# Altium footprint library TYCO THD.PcbLib: 146 footprints (part 10 of 11)
Each footprint in its own frame and in the unit in brackets; x right, y up, seen from the top. Pads: shape width x height; smd on the part's side, far side on the other; paste and mask are expansions set on the pad; w line width, h text height; cw(c..) or ccw(c..) is an arc to the next point about the centre after c.
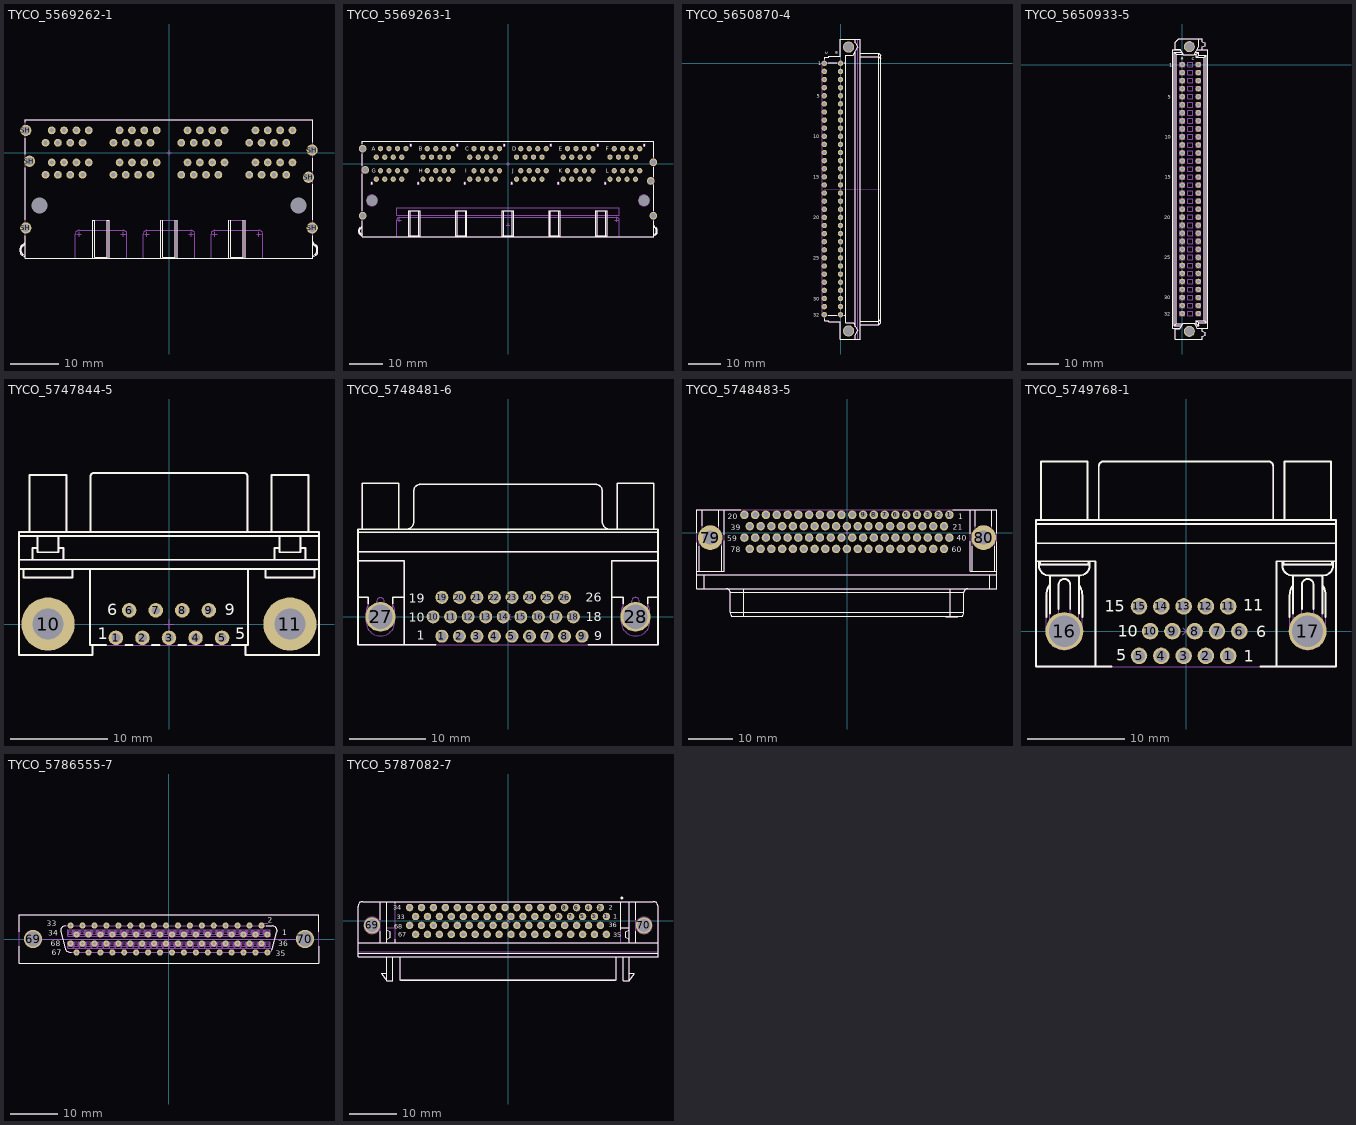
[diagram p9: the footprints below, top view; thin cyan lines are the x and y axes]

## TYCO_5569262-1 [mm] "2 x 4 Port RJ45 Jacks"
height 26.29
pads (72):
  round 1.6 hole 0.9: 1LCL(-11.43,-4.568) 1LCR(2.54,-4.568) 1LL(-25.4,-4.568) 1LR(16.51,-4.568) 1UCL(-2.54,4.572) 1UCR(11.43,4.572) 1UL(-16.51,4.572) 1UR(25.4,4.572) 2LCL(-10.16,-2.028) 2LCR(3.81,-2.028) 2LL(-24.13,-2.028) 2LR(17.78,-2.028) 2UCL(-3.81,2.032) 2UCR(10.16,2.032) 2UL(-17.78,2.032) 2UR(24.13,2.032) 3LCL(-8.89,-4.568) 3LCR(5.08,-4.568) 3LL(-22.86,-4.568) 3LR(19.05,-4.568) 3UCL(-5.08,4.572) 3UCR(8.89,4.572) 3UL(-19.05,4.572) 3UR(22.86,4.572) 4LCL(-7.62,-2.028) 4LCR(6.35,-2.028) 4LL(-21.59,-2.028) 4LR(20.32,-2.028) 4UCL(-6.35,2.032) 4UCR(7.62,2.032) 4UL(-20.32,2.032) 4UR(21.59,2.032) 5LCL(-6.35,-4.568) 5LCR(7.62,-4.568) 5LL(-20.32,-4.568) 5LR(21.59,-4.568) 5UCL(-7.62,4.572) 5UCR(6.35,4.572) 5UL(-21.59,4.572) 5UR(20.32,4.572) 6LCL(-5.08,-2.028) 6LCR(8.89,-2.028) 6LL(-19.05,-2.028) 6LR(22.86,-2.028) 6UCL(-8.89,2.032) 6UCR(5.08,2.032) 6UL(-22.86,2.032) 6UR(19.05,2.032) 7LCL(-3.81,-4.568) 7LCR(10.16,-4.568) 7LL(-17.78,-4.568) 7LR(24.13,-4.568) 7UCL(-10.16,4.572) 7UCR(3.81,4.572) 7UL(-24.13,4.572) 7UR(17.78,4.572) 8LCL(-2.54,-2.028) 8LCR(11.43,-2.028) 8LL(-16.51,-2.028) 8LR(25.4,-2.028) 8UCL(-11.43,2.032) 8UCR(2.54,2.032) 8UL(-25.4,2.032) 8UR(16.51,2.032)
  round 0.5 hole 3.3 unplated mask+1.4: M1(26.67,-10.918) M2(-26.67,-10.918)
  round 2.3 hole 1.6: SH(-29.46,-15.488) SH(-29.46,4.572) SH(-28.702,-1.778) SH(28.7,-5.078) SH(29.458,0.512) SH(29.46,-15.488)
Top Overlay:
  lines w0.2: -29.591,-21.39 -30.17,-21.12 cw(c-29.85,-20.434) -30.607,-20.434 -30.607,-19.68 cw(c-29.85,-19.68) -30.284,-19.06 -29.808,-18.726 ccw(c-30.099,-18.31) -29.591,-18.31 ; -29.591,-21.116 -30.065,-20.895 cw(c-29.85,-20.434) -30.358,-20.434 -30.358,-19.68 cw(c-29.85,-19.68) -30.141,-19.264 -29.665,-18.93 ccw(c-30.099,-18.31) -29.591,-18.871 ; -29.591,-17.133 -29.591,-21.712 29.591,-21.712 29.591,-17.133 ; -29.591,-13.843 -29.591,-3.168 ; -29.591,-0.388 -29.591,2.927 ; -29.591,6.217 -29.591,6.736 29.591,6.736 29.591,2.157 ; -15.684,-21.712 -15.684,-13.965 -15.24,-13.965 -15.24,-21.509 -12.7,-21.509 -12.7,-13.965 -12.255,-13.965 -12.255,-21.712 ; -1.714,-21.712 -1.714,-13.965 ; -1.27,-13.965 -1.27,-21.509 1.27,-21.509 1.27,-13.965 ; 1.714,-21.712 1.714,-13.965 ; 12.255,-21.712 12.255,-13.965 ; 12.7,-13.965 12.7,-21.509 15.24,-21.509 15.24,-13.965 ; 15.684,-21.712 15.684,-13.965 ; 29.591,-21.39 30.17,-21.12 ccw(c29.85,-20.434) 30.607,-20.434 30.607,-19.68 ccw(c29.85,-19.68) 30.284,-19.06 29.808,-18.726 cw(c30.099,-18.31) 29.591,-18.31 ; 29.591,-21.116 30.065,-20.895 ccw(c29.85,-20.434) 30.358,-20.434 30.358,-19.68 ccw(c29.85,-19.68) 30.141,-19.264 29.665,-18.93 cw(c30.099,-18.31) 29.591,-18.871 ; 29.591,-13.843 29.591,-6.467 ; 29.591,-3.689 29.591,-1.133
Mechanical 8:
  drawing of 331 lines, arcs and shapes, not listed
Mechanical 14:
  lines w0.1: -29.591,-21.39 -30.17,-21.12 cw(c-29.85,-20.434) -30.607,-20.434 -30.607,-19.68 cw(c-29.85,-19.68) -30.284,-19.06 -29.808,-18.726 ccw(c-30.099,-18.31) -29.591,-18.31 ; -29.591,-21.116 -30.065,-20.895 cw(c-29.85,-20.434) -30.358,-20.434 -30.358,-19.68 cw(c-29.85,-19.68) -30.141,-19.264 -29.665,-18.93 ccw(c-30.099,-18.31) -29.591,-18.871 ; -15.684,-21.712 -15.684,-13.965 -12.255,-13.965 -12.255,-21.712 ; -15.24,-13.965 -15.24,-21.509 -12.7,-21.509 -12.7,-13.965 ; -1.714,-21.712 -1.714,-13.965 1.714,-13.965 1.714,-21.712 ; -1.27,-13.965 -1.27,-21.509 1.27,-21.509 1.27,-13.965 ; 12.255,-21.712 12.255,-13.965 15.684,-13.965 15.684,-21.712 ; 12.7,-13.965 12.7,-21.509 15.24,-21.509 15.24,-13.965 ; 29.591,-21.39 30.17,-21.12 ccw(c29.85,-20.434) 30.607,-20.434 30.607,-19.68 ccw(c29.85,-19.68) 30.284,-19.06 29.808,-18.726 cw(c30.099,-18.31) 29.591,-18.31 ; 29.591,-21.116 30.065,-20.895 ccw(c29.85,-20.434) 30.358,-20.434 30.358,-19.68 ccw(c29.85,-19.68) 30.141,-19.264 29.665,-18.93 cw(c30.099,-18.31) 29.591,-18.871 ; -29.591,-21.712 29.591,-21.712 29.591,6.736 -29.591,6.736 -29.591,-21.712
3D body "TYCO_5569262-1.stp": height 26.29, standoff -4.06, extent -30.607,-21.712 30.607,6.736

## TYCO_5569263-1 [mm] "2 x 6 Port RJ45 Jacks"
height 26.27
pads (104):
  round 1.6 hole 0.9: 1A(-30.48,4.568) 1B(-16.51,4.568) 1C(-2.54,4.568) 1D(11.43,4.568) 1E(25.4,4.568) 1G(-39.37,-4.572) 1H(-25.4,-4.572) 1I(-11.43,-4.572) 1J(2.54,-4.572) 1K(16.51,-4.572) 1L(30.48,-4.572) 2A(-31.75,2.028) 2B(-17.78,2.028) 2C(-3.81,2.028) 2D(10.16,2.028) 2E(24.13,2.028) 2F(38.1,2.028) 2G(-38.1,-2.032) 2H(-24.13,-2.032) 2I(-10.16,-2.032) 2J(3.81,-2.032) 2K(17.78,-2.032) 2L(31.75,-2.032) 3A(-33.02,4.568) 3B(-19.05,4.568) 3C(-5.08,4.568) 3D(8.89,4.568) 3E(22.86,4.568) 3F(36.83,4.568) 3G(-36.83,-4.572) 3H(-22.86,-4.572) 3I(-8.89,-4.572) 3J(5.08,-4.572) 3K(19.05,-4.572) 3L(33.02,-4.572) 4A(-34.29,2.028) 4B(-20.32,2.028) 4C(-6.35,2.028) 4D(7.62,2.028) 4E(21.59,2.028) 4F(35.56,2.028) 4G(-35.56,-2.032) 4H(-21.59,-2.032) 4I(-7.62,-2.032) 4J(6.35,-2.032) 4K(20.32,-2.032) 4L(34.29,-2.032) 5A(-35.56,4.568) 5B(-21.59,4.568) 5C(-7.62,4.568) 5D(6.35,4.568) 5E(20.32,4.568) 5F(34.29,4.568) 5G(-34.29,-4.572) 5H(-20.32,-4.572) 5I(-6.35,-4.572) 5J(7.62,-4.572) 5K(21.59,-4.572) 5L(35.56,-4.572) 6A(-36.83,2.028) 6B(-22.86,2.028) 6C(-8.89,2.028) 6D(5.08,2.028) 6E(19.05,2.028) 6F(33.02,2.028) 6G(-33.02,-2.032) 6H(-19.05,-2.032) 6I(-5.08,-2.032) 6J(8.89,-2.032) 6K(22.86,-2.032) 6L(36.83,-2.032) 7A(-38.1,4.568) 7B(-24.13,4.568) 7C(-10.16,4.568) 7D(3.81,4.568) 7E(17.78,4.568) 7F(31.75,4.568) 7G(-31.75,-4.572) 7H(-17.78,-4.572) 7I(-3.81,-4.572) 7J(10.16,-4.572) 7K(24.13,-4.572) 7L(38.1,-4.572) 8A(-39.37,2.028) 8B(-25.4,2.028) 8C(-11.43,2.028) 8D(2.54,2.028) 8E(16.51,2.028) 8F(30.48,2.028) 8G(-30.48,-2.032) 8H(-16.51,-2.032) 8I(-2.54,-2.032) 8J(11.43,-2.032) 8K(25.4,-2.032) 8L(39.37,-2.032) F1(39.37,4.568)
  round 0.5 hole 3.3 unplated mask+1.4: M1(40.642,-10.922) M2(-40.64,-10.922)
  round 2.3 hole 1.6: SH(-43.43,-15.492) SH(-43.43,4.568) SH(-42.672,-1.782) SH(42.672,-5.082) SH(43.43,0.508) SH(43.432,-15.492)
Top Overlay:
  circle w0.3: c-40.75,-5.8 r0.15
  circle w0.3: c-26.86,-5.8 r0.15
  circle w0.3: c-12.89,-5.8 r0.15
  circle w0.3: c15.05,-5.8 r0.15
  circle w0.3: c1.08,-5.8 r0.15
  circle w0.3: c29.02,-5.8 r0.15
  circle w0.3: c40.75,5.6 r0.15
  circle w0.3: c26.78,5.6 r0.15
  circle w0.3: c12.81,5.6 r0.15
  circle w0.3: c-1.16,5.6 r0.15
  circle w0.3: c-15.13,5.6 r0.15
  circle w0.3: c-29.1,5.6 r0.15
  lines w0.2: -43.561,-21.4 -44.14,-21.13 cw(c-43.82,-20.444) -44.577,-20.444 -44.577,-19.69 cw(c-43.82,-19.69) -44.254,-19.07 -43.778,-18.736 ccw(c-44.069,-18.32) -43.561,-18.32 ; -43.561,-21.126 -44.035,-20.905 cw(c-43.82,-20.444) -44.328,-20.444 -44.328,-19.69 cw(c-43.82,-19.69) -44.205,-19.359 -43.635,-18.94 ccw(c-44.069,-18.32) -43.561,-18.881 ; -43.561,-16.986 -43.561,-21.717 43.561,-21.717 43.561,-16.986 ; -43.561,-13.998 -43.561,-2.989 ; -43.561,-0.575 -43.561,3.074 ; -43.561,6.062 -43.561,6.731 43.561,6.731 43.561,2.002 ; -29.654,-21.717 -29.654,-13.975 -26.226,-13.975 -26.226,-21.717 ; -29.654,-21.468 -29.21,-21.468 ; -29.21,-13.975 -29.21,-21.519 -26.67,-21.519 -26.67,-13.975 ; -26.67,-21.468 -26.226,-21.468 ; -15.686,-21.468 -15.24,-21.468 ; -15.684,-21.717 -15.684,-13.975 -12.255,-13.975 -12.255,-21.717 ; -15.24,-13.975 -15.24,-21.519 -12.7,-21.519 -12.7,-13.975 ; -12.7,-21.468 -12.255,-21.468 ; -1.714,-21.717 -1.714,-13.975 1.714,-13.975 1.714,-21.717 ; -1.705,-21.468 -1.27,-21.468 ; -1.27,-13.975 -1.27,-21.519 1.27,-21.519 1.27,-13.975 ; 1.27,-21.468 1.714,-21.468 ; 12.255,-21.717 12.255,-13.975 15.684,-13.975 15.684,-21.717 ; 12.255,-21.468 12.7,-21.468 ; 12.7,-13.975 12.7,-21.519 15.24,-21.519 15.24,-13.975 ; 15.24,-21.468 15.684,-21.468 ; 26.226,-21.717 26.226,-13.975 29.654,-13.975 29.654,-21.717 ; 26.226,-21.468 26.67,-21.468 ; 26.67,-13.975 26.67,-21.519 29.21,-21.519 29.21,-13.975 ; 29.21,-21.468 29.654,-21.468 ; 43.561,-21.4 44.14,-21.13 ccw(c43.82,-20.444) 44.577,-20.444 44.577,-19.69 ccw(c43.82,-19.69) 44.254,-19.07 43.778,-18.736 cw(c44.069,-18.32) 43.561,-18.32 ; 43.561,-21.126 44.035,-20.905 ccw(c43.82,-20.444) 44.328,-20.444 44.328,-19.69 ccw(c43.82,-19.69) 44.111,-19.274 43.635,-18.94 cw(c44.069,-18.32) 43.561,-18.881 ; 43.561,-13.998 43.561,-6.289 ; 43.561,-3.875 43.561,-0.986
  text "F" at 29.15,4 h1.2
  text "E" at 15.18,4 h1.2
  text "D" at 1.21,4 h1.2
  text "C" at -12.76,4 h1.2
  text "B" at -26.73,4 h1.2
  text "A" at -40.7,4 h1.2
  text "G" at -40.7,-2.6 h1.2
  text "H" at -26.73,-2.6 h1.2
  text "I" at -12.76,-2.6 h1.2
  text "J" at 1.21,-2.6 h1.2
  text "K" at 15.18,-2.6 h1.2
  text "L" at 29.15,-2.6 h1.2
Mechanical 8:
  drawing of 448 lines, arcs and shapes, not listed
Mechanical 14:
  circle w0.1: c-40.75,-5.8 r0.3
  circle w0.1: c-26.86,-5.8 r0.3
  circle w0.1: c-12.89,-5.8 r0.3
  circle w0.1: c15.05,-5.8 r0.3
  circle w0.1: c1.08,-5.8 r0.3
  circle w0.1: c29.02,-5.8 r0.3
  circle w0.1: c40.75,5.6 r0.3
  circle w0.1: c26.78,5.6 r0.3
  circle w0.1: c12.81,5.6 r0.3
  circle w0.1: c-1.16,5.6 r0.3
  circle w0.1: c-15.13,5.6 r0.3
  circle w0.1: c-29.1,5.6 r0.3
  lines w0.1: -43.561,-21.4 -44.14,-21.13 cw(c-43.82,-20.444) -44.577,-20.444 -44.577,-19.69 cw(c-43.82,-19.69) -44.254,-19.07 -43.778,-18.736 ccw(c-44.069,-18.32) -43.561,-18.32 ; -43.561,-21.126 -44.035,-20.905 cw(c-43.82,-20.444) -44.328,-20.444 -44.328,-19.69 cw(c-43.82,-19.69) -44.205,-19.359 -43.635,-18.94 ccw(c-44.069,-18.32) -43.561,-18.881 ; -29.654,-21.717 -29.654,-13.975 -26.226,-13.975 -26.226,-21.717 ; -29.654,-21.468 -29.21,-21.468 ; -29.21,-13.975 -29.21,-21.519 -26.67,-21.519 -26.67,-13.975 ; -26.67,-21.468 -26.226,-21.468 ; -15.686,-21.468 -15.24,-21.468 ; -15.684,-21.717 -15.684,-13.975 -12.255,-13.975 -12.255,-21.717 ; -15.24,-13.975 -15.24,-21.519 -12.7,-21.519 -12.7,-13.975 ; -12.7,-21.468 -12.255,-21.468 ; -1.714,-21.717 -1.714,-13.975 1.714,-13.975 1.714,-21.717 ; -1.705,-21.468 -1.27,-21.468 ; -1.27,-13.975 -1.27,-21.519 1.27,-21.519 1.27,-13.975 ; 1.27,-21.468 1.714,-21.468 ; 12.255,-21.717 12.255,-13.975 15.684,-13.975 15.684,-21.717 ; 12.255,-21.468 12.7,-21.468 ; 12.7,-13.975 12.7,-21.519 15.24,-21.519 15.24,-13.975 ; 15.24,-21.468 15.684,-21.468 ; 26.226,-21.717 26.226,-13.975 29.654,-13.975 29.654,-21.717 ; 26.226,-21.468 26.67,-21.468 ; 26.67,-13.975 26.67,-21.519 29.21,-21.519 29.21,-13.975 ; 29.21,-21.468 29.654,-21.468 ; 43.561,-21.4 44.14,-21.13 ccw(c43.82,-20.444) 44.577,-20.444 44.577,-19.69 ccw(c43.82,-19.69) 44.254,-19.07 43.778,-18.736 cw(c44.069,-18.32) 43.561,-18.32 ; 43.561,-21.126 44.035,-20.905 ccw(c43.82,-20.444) 44.328,-20.444 44.328,-19.69 ccw(c43.82,-19.69) 44.111,-19.274 43.635,-18.94 cw(c44.069,-18.32) 43.561,-18.881 ; -43.561,-21.717 43.561,-21.717 43.561,6.731 -43.561,6.731 -43.561,-21.717
  text "F" at 29.15,4 h1.2
  text "E" at 15.18,4 h1.2
  text "D" at 1.21,4 h1.2
  text "C" at -12.76,4 h1.2
  text "B" at -26.73,4 h1.2
  text "A" at -40.7,4 h1.2
  text "G" at -40.7,-2.6 h1.2
  text "H" at -26.73,-2.6 h1.2
  text "I" at -12.76,-2.6 h1.2
  text "J" at 1.21,-2.6 h1.2
  text "K" at 15.18,-2.6 h1.2
  text "L" at 29.15,-2.6 h1.2
3D body "TYCO_5569263-1.stp": height 26.33, standoff -4.06, extent -44.577,-21.717 44.577,6.731

## TYCO_5650870-4 [mm] "DIN 41612 Class 2, Type R, Thru-Hole; Rows a+c, 64 Positions, Performance level 2, Lead 2.79mm, Right Angle Female Connector"
height 9.11
pads (66):
  round 1.7 hole 1: a1(0,0) a2(0,-2.54) a3(0,-5.08) a4(0,-7.62) a5(0,-10.16) a6(0,-12.7) a7(0,-15.24) a8(0,-17.78) a9(0,-20.32) a10(0,-22.86) a11(0,-25.4) a12(0,-27.94) a13(0,-30.48) a14(0,-33.02) a15(0,-35.56) a16(0,-38.1) a17(0,-40.64) a18(0,-43.18) a19(0,-45.72) a20(0,-48.26) a21(0,-50.8) a22(0,-53.34) a23(0,-55.88) a24(0,-58.42) a25(0,-60.96) a26(0,-63.5) a27(0,-66.04) a28(0,-68.58) a29(0,-71.12) a30(0,-73.66) a31(0,-76.2) a32(0,-78.74) c1(-5.08,0) c2(-5.08,-2.54) c3(-5.08,-5.08) c4(-5.08,-7.62) c5(-5.08,-10.16) c6(-5.08,-12.7) c7(-5.08,-15.24) c8(-5.08,-17.78) c9(-5.08,-20.32) c10(-5.08,-22.86) c11(-5.08,-25.4) c12(-5.08,-27.94) c13(-5.08,-30.48) c14(-5.08,-33.02) c15(-5.08,-35.56) c16(-5.08,-38.1) c17(-5.08,-40.64) c18(-5.08,-43.18) c19(-5.08,-45.72) c20(-5.08,-48.26) c21(-5.08,-50.8) c22(-5.08,-53.34) c23(-5.08,-55.88) c24(-5.08,-58.42) c25(-5.08,-60.96) c26(-5.08,-63.5) c27(-5.08,-66.04) c28(-5.08,-68.58) c29(-5.08,-71.12) c30(-5.08,-73.66) c31(-5.08,-76.2) c32(-5.08,-78.74)
  round 3.5 / inner round 3.5 / far side round 5.1 hole 2.8: MTG1(2.54,5.08) MTG2(2.54,-83.82)
Top Overlay:
  lines w0.2: -5.01,-79.988 -5.01,-80.685 -3.76,-80.685 -3.76,-81 -0.06,-81 -0.06,-86.36 6.14,-86.36 6.14,7.62 -0.06,7.62 -0.06,2.26 -3.76,2.26 -3.76,1.945 -5.01,1.945 -5.01,1.248 ; -3.839,-78.89 -1.241,-78.89 ; -3.839,0.15 -1.241,0.15 ; 1.241,-78.89 1.64,-78.89 ; 1.241,0.15 1.64,0.15 ; 4.64,-86.36 4.64,-85.163 5.415,-83.82 3.978,-81.33 1.64,-81.33 1.64,2.59 3.978,2.59 5.415,5.08 4.64,6.423 4.64,7.62 ; 4.64,-82.477 4.64,3.737 ; 6.14,-81.82 12.03,-81.82 ; 6.14,-80.78 12.03,-80.78 12.64,-80.17 ; 6.14,2.04 12.03,2.04 12.64,1.43 ; 6.14,3.08 12.03,3.08 ; 12.03,-81.82 12.03,3.08 ; 12.03,-81.82 12.64,-81.21 12.64,2.47 12.03,3.08
  text "1" at -7.045,-0.55 h1.2
  text "c" at -4.055,2.865 h1.2
  text "a" at -0.8,2.915 h1.2
  text "32" at -8.57,-79.39 h1.2
  text "5" at -7.445,-10.86 h1.2
  text "10" at -8.495,-23.51 h1.2
  text "15" at -8.47,-36.11 h1.2
  text "20" at -8.57,-48.91 h1.2
  text "25" at -8.57,-61.61 h1.2
  text "30" at -8.57,-74.31 h1.2
Mechanical 8:
  drawing of 267 lines, arcs and shapes, not listed
  text "PCB" at 5.08,-41.275 h1.2
Mechanical 14:
  lines w0.1: -5.01,-78.89 -5.01,-80.685 -3.76,-80.685 -3.76,-81 -0.06,-81 -0.06,-86.36 6.14,-86.36 6.14,7.62 -0.06,7.62 -0.06,2.26 -3.76,2.26 -3.76,1.945 -5.01,1.945 -5.01,0.15 ; 1.64,-78.89 -5.72,-78.89 -5.72,0.15 1.64,0.15 ; 4.64,-86.36 4.64,-85.163 5.415,-83.82 3.978,-81.33 1.64,-81.33 1.64,2.59 3.978,2.59 5.415,5.08 4.64,6.423 4.64,7.62 ; 4.64,-82.477 4.64,3.737 ; 6.14,-81.82 12.03,-81.82 ; 6.14,-80.78 12.03,-80.78 12.64,-80.17 ; 6.14,2.04 12.03,2.04 12.64,1.43 ; 6.14,3.08 12.03,3.08 ; 12.03,-81.82 12.03,3.08 ; 12.03,-81.82 12.64,-81.21 12.64,2.47 12.03,3.08 ; 1.005,-84.16 1.005,-83.48 1.316,-83.48 cw(c2.54,-83.82) 3.764,-83.48 4.075,-83.48 4.075,-84.16 3.764,-84.16 cw(c2.54,-83.82) 1.316,-84.16 1.005,-84.16 ; 1.005,4.74 1.316,4.74 ccw(c2.54,5.08) 3.764,4.74 4.075,4.74 4.075,5.42 3.764,5.42 ccw(c2.54,5.08) 1.316,5.42 1.005,5.42 1.005,4.74
  text "1" at -7.045,-0.55 h1.2
  text "c" at -4.055,2.865 h1.2
  text "a" at -0.8,2.915 h1.2
  text "32" at -8.57,-79.39 h1.2
  text "5" at -7.445,-10.86 h1.2
  text "10" at -8.495,-23.51 h1.2
  text "15" at -8.47,-36.11 h1.2
  text "20" at -8.57,-48.91 h1.2
  text "25" at -8.57,-61.61 h1.2
  text "30" at -8.57,-74.31 h1.2
3D body "TYCO_5650870-4.stp": height 9.11, standoff -2.79, extent -5.72,-86.36 12.64,7.62

## TYCO_5650933-5 [mm] "DIN 41612, Type C,  Thru-Hole; Rows a+c, 64 Position, Performance level 2, Lead 3mm, Pitch 2.54mm, Straight Male Connector"
height 11.51
pads (66):
  round 1.7 hole 1: a1(0,0) a2(0,-2.54) a3(0,-5.08) a4(0,-7.62) a5(0,-10.16) a6(0,-12.7) a7(0,-15.24) a8(0,-17.78) a9(0,-20.32) a10(0,-22.86) a11(0,-25.4) a12(0,-27.94) a13(0,-30.48) a14(0,-33.02) a15(0,-35.56) a16(0,-38.1) a17(0,-40.64) a18(0,-43.18) a19(0,-45.72) a20(0,-48.26) a21(0,-50.8) a22(0,-53.34) a23(0,-55.88) a24(0,-58.42) a25(0,-60.96) a26(0,-63.5) a27(0,-66.04) a28(0,-68.58) a29(0,-71.12) a30(0,-73.66) a31(0,-76.2) a32(0,-78.74) c1(5.08,0) c2(5.08,-2.54) c3(5.08,-5.08) c4(5.08,-7.62) c5(5.08,-10.16) c6(5.08,-12.7) c7(5.08,-15.24) c8(5.08,-17.78) c9(5.08,-20.32) c10(5.08,-22.86) c11(5.08,-25.4) c12(5.08,-27.94) c13(5.08,-30.48) c14(5.08,-33.02) c15(5.08,-35.56) c16(5.08,-38.1) c17(5.08,-40.64) c18(5.08,-43.18) c19(5.08,-45.72) c20(5.08,-48.26) c21(5.08,-50.8) c22(5.08,-53.34) c23(5.08,-55.88) c24(5.08,-58.42) c25(5.08,-60.96) c26(5.08,-63.5) c27(5.08,-66.04) c28(5.08,-68.58) c29(5.08,-71.12) c30(5.08,-73.66) c31(5.08,-76.2) c32(5.08,-78.74)
  round 3.5 / inner round 3.5 / far side round 5.1 hole 2.8: MTG1(2.24,5.64) MTG2(2.24,-84.36)
Top Overlay:
  lines w0.2: -2.195,-83.612 -0.735,-83.612 0.3,-81.82 3.73,-81.82 4.645,-83.405 8.04,-83.405 8.04,4.685 4.645,4.685 ; -2.195,-83.405 -2.195,-86.795 6.285,-86.795 6.285,-85.905 7.275,-85.545 7.275,-84.655 6.285,-84.294 6.285,-83.405 ; -2.195,4.685 -2.195,7.055 -1.175,8.075 6.285,8.075 6.285,7.185 7.275,6.825 7.275,5.935 6.285,5.575 6.285,4.685 ; -2.195,4.892 -0.735,4.892 0.3,3.1 3.73,3.1 5.197,5.64 5.197,8.075 ; -0.615,-83.405 -2.96,-83.405 -2.96,4.685 -0.615,4.685 ; -0.188,-82.665 -2.49,-82.665 ; -0.188,3.945 -2.49,3.945 ; 0.193,-82.005 -1.83,-82.005 ; 0.193,3.285 -1.83,3.285 ; 3.837,-82.005 4.5,-82.005 ; 3.837,3.285 4.5,3.285 ; 4.218,-82.665 5.16,-82.665 ; 4.218,3.945 5.16,3.945 ; -2.49,-82.665 -2.49,3.945 ; -2.49,-82.665 -1.83,-82.005 ; -2.49,3.945 -1.83,3.285 ; -1.83,-82.005 -1.83,3.285 ; 4.5,-82.005 4.5,-81.065 ; 4.5,-82.005 5.16,-82.665 ; 4.5,-81.065 5.16,-81.725 ; 4.5,-81.065 6.91,-81.065 ; 4.5,2.345 6.91,2.345 ; 4.5,2.345 5.16,3.005 ; 4.5,2.345 4.5,3.285 ; 4.5,3.285 5.16,3.945 ; 5.16,-82.665 5.16,-81.725 ; 5.16,-81.725 7.57,-81.725 ; 5.16,3.005 7.57,3.005 ; 5.16,3.005 5.16,3.945 ; 6.91,-81.065 6.91,2.345 ; 6.91,-81.065 7.57,-81.725 ; 6.91,2.345 7.57,3.005 ; 7.57,-81.725 7.57,3.005
  text "10" at -5.475,-23.46 h1.2
  text "c" at 2.995,1.37 h1.2
  text "a" at -0.4,1.445 h1.2
  text "32" at -5.675,-79.365 h1.2
  text "5" at -4.55,-10.835 h1.2
  text "30" at -5.675,-74.285 h1.2
  text "25" at -5.675,-61.585 h1.2
  text "20" at -5.675,-48.885 h1.2
  text "15" at -5.475,-36.135 h1.2
  text "1" at -4.075,-0.675 h1.2
Mechanical 8:
  drawing of 264 lines, arcs and shapes, not listed
Mechanical 14:
  drawing of 700 lines, arcs and shapes, not listed
  text "10" at -5.475,-23.46 h1.2
  text "32" at -5.675,-79.365 h1.2
  text "5" at -4.55,-10.835 h1.2
  text "30" at -5.675,-74.285 h1.2
  text "25" at -5.675,-61.585 h1.2
  text "20" at -5.675,-48.885 h1.2
  text "15" at -5.475,-36.135 h1.2
  text "1" at -4.075,-0.675 h1.2
  text "a" at -0.4,1.445 h1.2
  text "c" at -1.445,5.06 h1.2
3D body "TYCO_5650933-5.stp": height 11.51, standoff -3.3, extent -2.96,-86.795 8.04,8.075

## TYCO_5747844-5 [mm] "Right Angle 9 Female Contacts D-SUB Connector With PCB Mount Retention , Grounding Straps, and Fixed UNC 4-40 Female Screwlocks"
height 12.92
pads (11):
  round 1.5 hole 0.9: 1(-5.48,-1.422) 2(-2.74,-1.422) 3(0,-1.422) 4(2.74,-1.422) 5(5.48,-1.422) 6(-4.11,1.422) 7(-1.37,1.422) 8(1.37,1.422) 9(4.11,1.422)
  round 5.5 hole 3.2 unplated mask+0.102: 10(-12.495,0)
  round 5.5 hole 3.2: 11(12.495,0)
Top Overlay:
  lines w0.2: -15.494,5.679 15.494,5.679 ; -15.494,6.645 15.494,6.645 ; -15.494,9.108 15.494,9.108 ; -15.011,5.679 -15.011,4.79 -9.982,4.79 -9.982,5.679 ; -14.402,9.525 -14.402,15.408 -10.592,15.408 -10.592,9.525 ; -14.084,6.645 -14.084,7.838 -13.576,7.838 ; -13.576,9.108 -13.576,7.422 -11.417,7.422 -11.417,9.108 ; -11.417,7.838 -10.909,7.838 -10.909,6.645 ; -8.153,5.679 -8.153,-2.169 -6.482,-2.169 ; -8.1,9.525 -8.1,15.296 cw(c-7.8,15.296) -7.8,15.596 7.8,15.596 cw(c7.8,15.296) 8.1,15.296 8.1,9.525 ; -7.899,-2.169 -7.899,-3.185 -15.494,-3.185 -15.494,9.525 15.494,9.525 15.494,-3.185 7.899,-3.185 7.899,-2.169 ; -4.478,-2.169 -3.742,-2.169 ; -1.738,-2.169 -1.002,-2.169 ; 1.002,-2.169 1.738,-2.169 ; 3.742,-2.169 4.478,-2.169 ; 6.482,-2.169 8.153,-2.169 8.153,5.679 ; 9.982,5.679 9.982,4.79 15.011,4.79 15.011,5.679 ; 10.592,9.525 10.592,15.408 14.402,15.408 14.402,9.525 ; 10.909,6.645 10.909,7.838 11.417,7.838 ; 11.417,9.108 11.417,7.422 13.576,7.422 13.576,9.108 ; 13.576,7.838 14.084,7.838 14.084,6.645
  text "6" at -6.375,0.925 h1.2
  text "5" at 6.85,-1.575 h1.2
  text "1" at -7.35,-1.575 h1.2
  text "9" at 5.75,0.925 h1.2
Mechanical 8:
  circle w0.1: c-12.495,0 r1.6
  circle w0.1: c12.495,0 r1.6
  circle w0.1: c-4.11,1.422 r0.5
  circle w0.1: c-5.48,-1.422 r0.5
  circle w0.1: c4.11,1.422 r0.5
  circle w0.1: c5.48,-1.422 r0.5
  lines w0.1: -12.995,0 -12.495,0 ; -12.495,-0.5 -12.495,0 ; -12.495,0.5 -12.495,0 ; -11.995,0 -12.495,0 ; -5.98,-1.422 -5.48,-1.422 ; -5.48,-1.922 -5.48,-1.422 ; -5.48,-0.922 -5.48,-1.422 ; -4.98,-1.422 -5.48,-1.422 ; -4.61,1.422 -4.11,1.422 ; -4.11,0.922 -4.11,1.422 ; -4.11,1.922 -4.11,1.422 ; -3.61,1.422 -4.11,1.422 ; -3.24,-1.422 -2.74,-1.422 ; -2.74,-1.922 -2.74,-1.422 ; -2.74,-0.922 -2.74,-1.422 ; -2.24,-1.422 -2.74,-1.422 ; -1.87,1.422 -1.37,1.422 ; -1.37,0.922 -1.37,1.422 ; -1.37,1.922 -1.37,1.422 ; -0.87,1.422 -1.37,1.422 ; -0.5,-1.422 0,-1.422 ; -0.5,0 0,0 ; 0,-1.922 0,-1.422 ; 0,-0.922 0,-1.422 ; 0,-0.5 0,0 ; 0,0.5 0,0 ; 0.5,-1.422 0,-1.422 ; 0.5,0 0,0 ; 0.87,1.422 1.37,1.422 ; 1.37,0.922 1.37,1.422 ; 1.37,1.922 1.37,1.422 ; 1.87,1.422 1.37,1.422 ; 2.24,-1.422 2.74,-1.422 ; 2.74,-1.922 2.74,-1.422 ; 2.74,-0.922 2.74,-1.422 ; 3.24,-1.422 2.74,-1.422 ; 3.61,1.422 4.11,1.422 ; 4.11,0.922 4.11,1.422 ; 4.11,1.922 4.11,1.422 ; 4.61,1.422 4.11,1.422 ; 4.98,-1.422 5.48,-1.422 ; 5.48,-1.922 5.48,-1.422 ; 5.48,-0.922 5.48,-1.422 ; 5.98,-1.422 5.48,-1.422 ; 11.995,0 12.495,0 ; 12.495,-0.5 12.495,0 ; 12.495,0.5 12.495,0 ; 12.995,0 12.495,0
Mechanical 14:
  circle w0.1: c-12.497,0 r1.854
  circle w0.1: c-12.497,0 r1.549
  circle w0.1: c12.497,0 r1.854
  circle w0.1: c12.497,0 r1.549
  lines w0.1: -15.494,5.679 15.494,5.679 ; -15.494,6.645 15.494,6.645 ; -15.494,9.108 15.494,9.108 ; -15.011,5.679 -15.011,4.79 -9.982,4.79 -9.982,5.679 ; -14.402,9.525 -14.402,15.408 -10.592,15.408 -10.592,9.525 ; -14.084,6.645 -14.084,7.838 -13.576,7.838 ; -13.576,9.108 -13.576,7.422 -11.417,7.422 -11.417,9.108 ; -11.417,7.838 -10.909,7.838 -10.909,6.645 ; -8.153,5.679 -8.153,-2.169 8.153,-2.169 8.153,5.679 ; -8.1,9.525 -8.1,15.296 cw(c-7.8,15.296) -7.8,15.596 7.8,15.596 cw(c7.8,15.296) 8.1,15.296 8.1,9.525 ; -7.899,-2.169 -7.899,-3.185 -15.494,-3.185 -15.494,9.525 15.494,9.525 15.494,-3.185 7.899,-3.185 7.899,-2.169 ; 9.982,5.679 9.982,4.79 15.011,4.79 15.011,5.679 ; 10.592,9.525 10.592,15.408 14.402,15.408 14.402,9.525 ; 10.909,6.645 10.909,7.838 11.417,7.838 ; 11.417,9.108 11.417,7.422 13.576,7.422 13.576,9.108 ; 13.576,7.838 14.084,7.838 14.084,6.645